# Altium footprint library FxPcbLib.PcbLib: 112 footprints (part 6 of 7)
Each footprint in its own frame and in the unit in brackets; x right, y up, seen from the top. Pads: shape width x height; smd on the part's side, far side on the other; paste and mask are expansions set on the pad; w line width, h text height; cw(c..) or ccw(c..) is an arc to the next point about the centre after c.
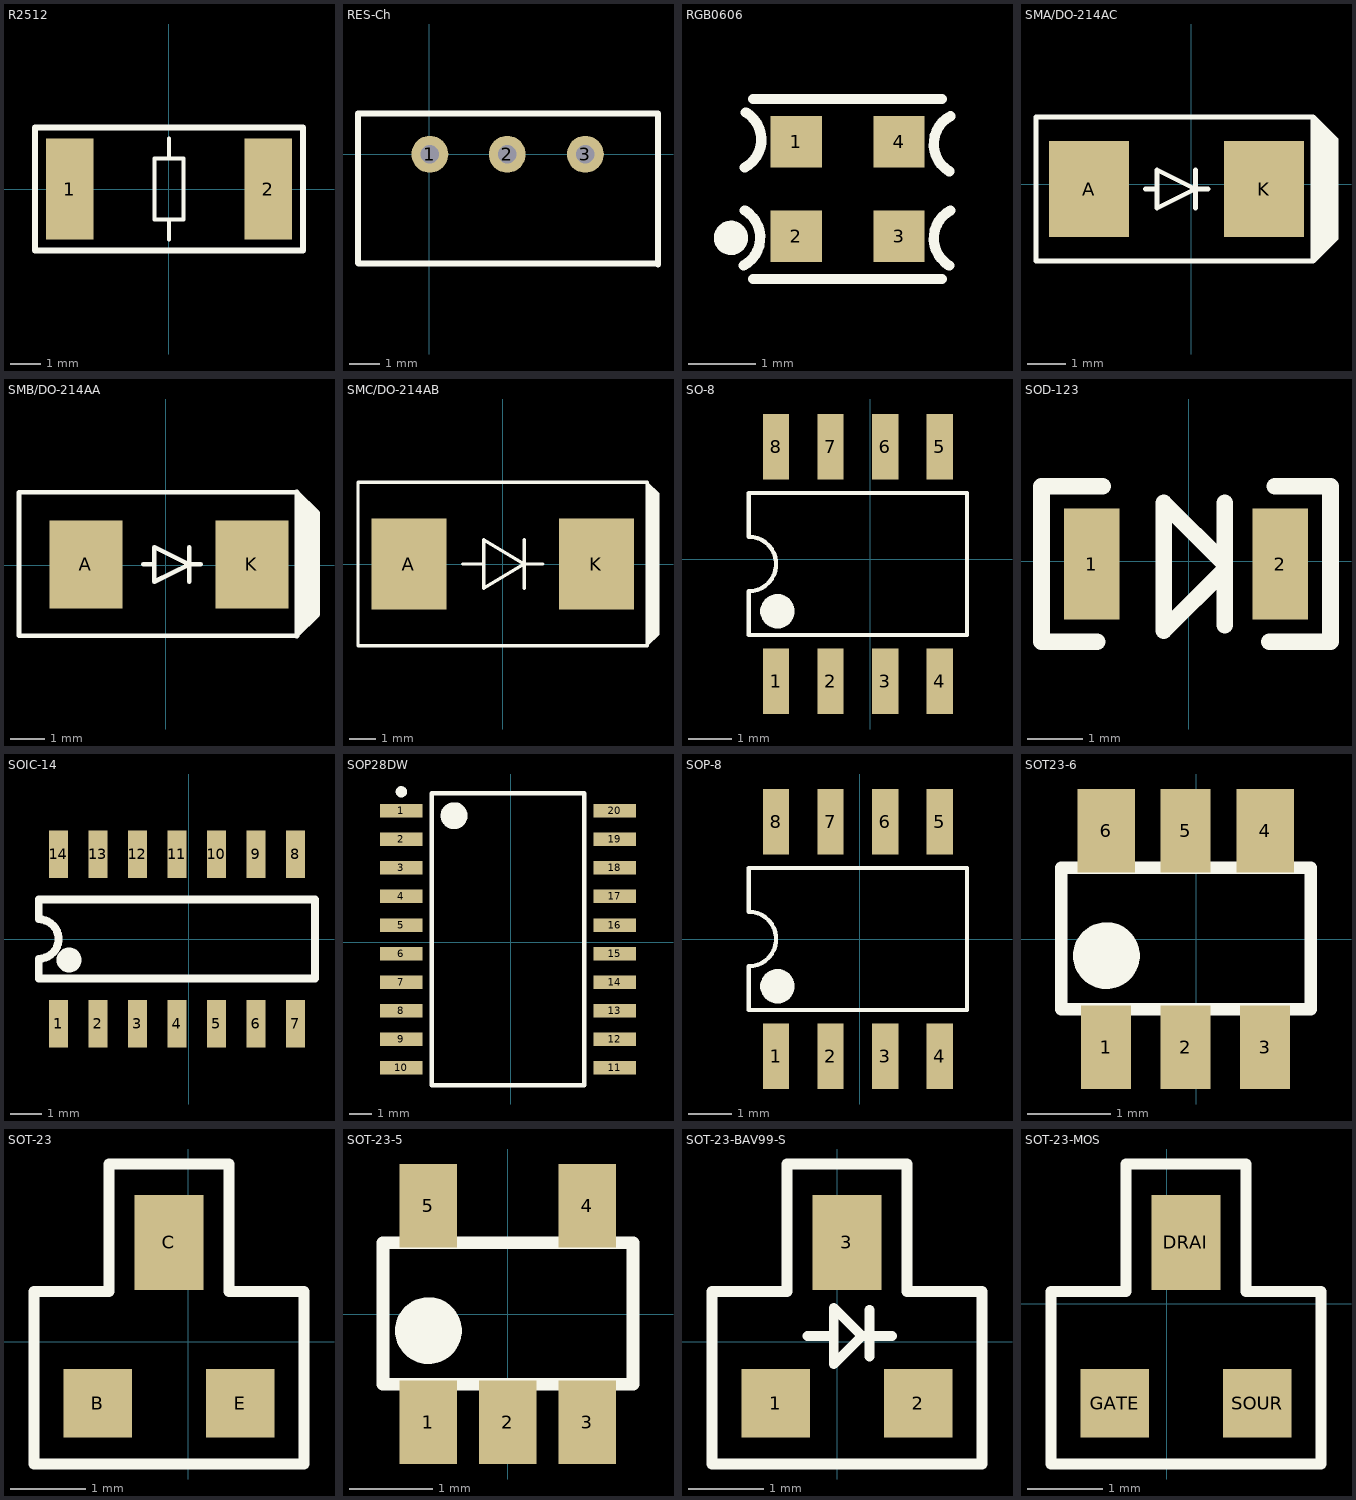
[diagram p5: the footprints below, top view; thin cyan lines are the x and y axes]

## R2512 [mil]
pads (2):
  rect 61x129.92 smd: 1(-127.5,0) 2(127.5,0)
Top Overlay:
  lines w5.12: 0,-64.96 0,-39.37 ; 0,39.37 0,64.96 ; -18.7,-39.37 -18.7,39.37 18.7,39.37 18.7,-39.37 -18.7,-39.37
  lines w7.87: -171.78,-78.74 171.78,-78.74 171.78,78.74 -171.78,78.74 -171.78,-78.74
3D body: height 24.44, standoff 0, extent -124.39,-63 124.4,63

## RES-Ch [mm]
pads (3):
  round 1.2 hole 0.6: 1(0.025,0) 2(2.54,0) 3(5.08,0)
Top Overlay:
  lines w0.203: -2.311,-3.531 -2.311,1.321 7.442,1.321 7.442,-3.581 7.417,-3.556 -2.286,-3.556 -2.311,-3.531
3D body: height 11.97, standoff -4.3, extent -2.36,-3.607 7.44,1.343

## RGB0606 [mil]
pads (4):
  rect 30x30 smd: 1(-49347,-49322) 2(-49347,-49377) 3(-49287,-49377) 4(-49287,-49322)
Top Overlay:
  circle w10: c-49385,-49378 r5
  lines w6: -49377.67,-49394.13 ccw(c-49386.37,-49377.88) -49377,-49362 ; -49377,-49337 ccw(c-49385.7,-49320.74) -49376.33,-49304.87 ; -49372,-49402 -49262,-49402 ; -49372,-49297 -49262,-49297 ; -49257.67,-49394.13 cw(c-49248.3,-49378.26) -49257,-49362 ; -49257.67,-49339.13 cw(c-49248.3,-49323.26) -49257,-49307

## SMA/DO-214AC [mil]
pads (2):
  rect 83x100 smd: A(-105.61,-5) K(75.61,-5)
Top Overlay:
  region: 150.24,46.06 126.46,46.06 126.46,-55.91 150.24,-55.91
  lines w5.12: -47.5,-5 -35.26,-5 ; 4.43,-24.68 4.43,14.69 ; 17.5,-5 4.43,-5 ; 127.48,-65.51 146.06,-46.93 ; 127.48,55.51 146.06,36.93 ; 127.56,-60.51 146.14,-41.93 ; 127.56,50.51 146.14,31.93 ; 128.07,-69.21 146.65,-50.63 ; 128.07,59.21 146.65,40.63 ; 128.98,-72.91 147.56,-54.33 ; 128.98,62.91 147.56,44.33 ; -35.26,-5 -35.26,-24.68 4.43,-5 ; -35.26,-5 -35.26,14.69 4.43,-5 ; 126.61,-79.8 -160.73,-79.8 -160.73,69.8 126.61,69.8 ; 126.61,-79.8 126.61,69.8 ; 126.61,-79.8 150.24,-56.18 150.24,46.18 126.61,69.8
3D body: height 94.69, standoff 0, extent -115.98,-53.62 88.74,48.74

## SMB/DO-214AA [mil]
pads (2):
  rect 83x100 smd: A(-91,1) K(97.61,1)
Top Overlay:
  region: 174,51.97 150.22,51.97 150.22,-50 174,-50
  lines w5.12: -25.5,1 -13.26,1 ; 26.43,-18.68 26.43,20.68 ; 39.5,1 26.43,1 ; 148.61,-73.8 172.24,-50.18 172.24,52.18 148.61,75.8 ; 149.48,-59.51 168.06,-40.93 ; 149.48,61.51 168.06,42.93 ; 149.56,-54.51 168.14,-35.93 ; 149.56,56.51 168.14,37.93 ; 150.07,-63.21 168.65,-44.63 ; 150.07,65.21 168.65,46.63 ; 150.98,-66.91 169.56,-48.33 ; 150.98,68.91 169.56,50.33 ; -13.26,1 -13.26,-18.68 26.43,1 ; -13.26,1 -13.26,20.68 26.43,1 ; -167,-80 148.61,-80 148.61,83 -167,83 -167,-80
  lines w6: 148.61,-80 148.61,-79.39 172.24,-55.76 ; 148.61,83 172.24,59.38 172.24,-55.76 ; 172.24,-50.18 172.24,-55.76
3D body: height 39.57, standoff -51.18, extent -101.29,-69.87 111.3,71.87

## SMC/DO-214AB [mm]
pads (2):
  rect 2.8x3.4 smd: A(-3.5,0) K(3.5,0)
Top Overlay:
  region: 5.55,2.9 5.4,2.9 5.4,2.55 5.55,2.55
  region: 5.6,2.8 5.425,2.8 5.425,2.55 5.6,2.55
  region: 5.7,2.725 5.525,2.725 5.525,2.55 5.7,2.55
  region: 5.775,2.65 5.4,2.65 5.4,-2.675 5.775,-2.675
  region: 5.65,-2.575 5.375,-2.575 5.375,-2.75 5.65,-2.75
  region: 5.6,-2.65 5.425,-2.65 5.425,-2.825 5.6,-2.825
  region: 5.525,-2.725 5.425,-2.725 5.425,-2.85 5.525,-2.85
  lines w0.127: -1.5,0 -0.7,0 ; 0.793,0 1.5,0 ; 0.8,-0.9 0.8,0.9 ; 5.4,-3 5.8,-2.6 5.8,2.6 5.4,3 ; -0.7,0 -0.7,0.9 0.8,0 -0.7,-0.9 -0.7,0 ; -5.4,-3.048 -5.4,3.048 5.4,3.048 5.4,-3.048 -5.4,-3.048
3D body: height 2.3, standoff 0, extent -4.102,-2.979 3.848,2.921

## SO-8 [mil]
pads (8):
  rect 24x60 smd: 1(-86.5,-112.07) 2(-36.5,-112.07) 3(13.5,-112.07) 4(63.5,-112.07) 5(63.5,102.93) 6(13.5,102.93) 7(-36.5,102.93) 8(-86.5,102.93)
Top Overlay:
  circle w19.68: c-85.32,-47.87 r5.91
  lines w3.94: -111.5,-69.57 -111.5,-29.57 ccw(c-111.49,-4.57) -111.49,20.43 -111.5,60.43 88.5,60.43 88.5,-69.57 -111.5,-69.57
3D body: height 57, standoff 0, extent -108,-118.75 85,108.75

## SOD-123 [mm]
pads (2):
  rect 1x2 smd: 1(-1.753,-0.051) 2(1.647,-0.051)
Top Overlay:
  lines w0.3: -1.653,-1.451 -2.653,-1.451 -2.653,1.349 -1.553,1.349 ; 0.647,-1.151 0.647,1.049 ; 0.647,-0.151 -0.453,-1.251 -0.453,1.049 0.647,-0.051 ; 1.447,-1.451 2.547,-1.451 2.547,1.349 1.547,1.349
3D body: height 1.2, standoff 0, extent -1.903,-0.851 1.797,0.749

## SOIC-14 [mil]
pads (14):
  rect 24x60 smd: 1(-165,-107.5) 2(-115,-107.5) 3(-65,-107.5) 4(-15,-107.5) 5(35,-107.5) 6(85,-107.5) 7(135,-107.5) 8(135,107.5) 9(85,107.5) 10(35,107.5) 11(-15,107.5) 12(-65,107.5) 13(-115,107.5) 14(-165,107.5)
Top Overlay:
  circle w19.68: c-151.71,-26.57 r5.91
  lines w10: -190,-50 -190,-25 ccw(c-190,0) -190,25 -190,50 160,50 160,-50 -190,-50
3D body: height 68.9, standoff 0, extent -187.24,-120 157.24,116.22

## SOP28DW [mm]
pads (20):
  rect 1.9x0.6 smd: 1(-4.877,5.842) 2(-4.877,4.572) 3(-4.877,3.302) 4(-4.877,2.032) 5(-4.877,0.762) 6(-4.877,-0.508) 7(-4.877,-1.778) 8(-4.877,-3.048) 9(-4.877,-4.318) 10(-4.877,-5.588) 11(4.623,-5.588) 12(4.623,-4.318) 13(4.623,-3.048) 14(4.623,-1.778) 15(4.623,-0.508) 16(4.623,0.762) 17(4.623,2.032) 18(4.623,3.302) 19(4.623,4.572) 20(4.623,5.842)
Top Overlay:
  circle w0.25: c-4.877,6.692 r0.125
  circle w0.6: c-2.527,5.627 r0.3
  lines w0.2: -3.527,-6.373 -3.527,6.627 3.273,6.627 3.273,-6.373 -3.527,-6.373
3D body: height 2.51, standoff 0, extent -5.28,-6.223 5.026,6.477

## SOP-8 [mil]
pads (8):
  rect 24x60 smd: 1(-76.5,-107.07) 2(-26.5,-107.07) 3(23.5,-107.07) 4(73.5,-107.07) 5(73.5,107.93) 6(23.5,107.93) 7(-26.5,107.93) 8(-76.5,107.93)
Top Overlay:
  circle w19.68: c-75.32,-42.87 r5.91
  lines w3.94: -101.5,-64.57 98.5,-64.57 98.5,65.43 -101.49,65.43 -101.5,25.43 cw(c-101.49,0.43) -101.49,-24.57 -101.5,-64.57
3D body: height 57, standoff 0, extent -98,-113.75 95,113.75

## SOT23-6 [mm]
pads (6):
  rect 0.6x1 smd: 1(-1.08,-1.3) 2(-0.127,-1.3) 3(0.826,-1.3) 5(-0.127,1.3)
  rect 0.69x1 smd: 4(0.826,1.3) 6(-1.08,1.3)
Top Overlay:
  circle w0.5: c-1.077,-0.2 r0.15
  lines w0.15: -1.622,-0.845 -1.622,0.855 1.278,0.855 1.378,0.855 1.378,-0.845 1.278,-0.845 -1.622,-0.845
3D body: height 1.45, standoff 0, extent -1.651,-1.397 1.249,1.403

## SOT-23 [mil]
pads (3):
  rect 36x36 smd: B(-47.4,-32.18) E(27.4,-32.18)
  rect 36x50 smd: C(-10,52.18)
Top Overlay:
  lines w5.91: -80.87,-64.11 60.87,-64.11 60.87,26.44 21.5,26.44 21.5,93.37 -41.5,93.37 -41.5,26.44 -80.87,26.44 -80.87,-64.11
3D body: height 43, standoff 0, extent -65,-41 45,55

## SOT-23-5 [mm]
pads (5):
  rect 0.69x1 smd: 1(-0.953,-1.3) 2(0,-1.3) 3(0.953,-1.3) 4(0.953,1.3) 5(-0.953,1.3)
Top Overlay:
  circle w0.5: c-0.95,-0.2 r0.15
  lines w0.15: -1.495,-0.845 1.405,-0.845 1.505,-0.845 1.505,0.855 1.405,0.855 -1.495,0.855 -1.495,-0.845
3D body: height 1.2, standoff 0, extent -1.397,-1.4 1.503,1.4

## SOT-23-BAV99-S [mil]
pads (3):
  rect 36x36 smd: 1(-32.4,-32.18) 2(42.4,-32.18)
  rect 36x50 smd: 3(5,52.18)
Top Overlay:
  lines w5.12: -15.67,3.11 -1.89,3.11 ; 16.81,-7.72 16.81,16.89 ; 28.62,3.11 12.87,3.11 ; 12.87,3.11 -1.89,-11.65 -1.89,-4.76 -1.89,17.87 12.87,3.11
  lines w5.91: -65.87,-64.11 75.87,-64.11 75.87,26.44 36.5,26.44 36.5,93.37 -26.5,93.37 -26.5,26.44 -65.87,26.44 -65.87,-64.11
3D body: height 43, standoff 0, extent -50,-36 60,60

## SOT-23-MOS [mil]
pads (3):
  rect 36x50 smd: DRAI(10,32.18)
  rect 36x36 smd: GATE(-27.4,-52.18) SOUR(47.4,-52.18)
Top Overlay:
  lines w5.91: -60.87,-84.11 -60.87,6.44 -21.5,6.44 -21.5,73.37 41.5,73.37 41.5,6.44 80.87,6.44 80.87,-84.11 -60.87,-84.11
3D body: height 43, standoff 0, extent -45,-61 65,35